# Altium footprint library PcbLib.PcbLib: 428 footprints (part 7 of 27)
Each footprint in its own frame and in the unit in brackets; x right, y up, seen from the top. Pads: shape width x height; smd on the part's side, far side on the other; paste and mask are expansions set on the pad; w line width, h text height; cw(c..) or ccw(c..) is an arc to the next point about the centre after c.
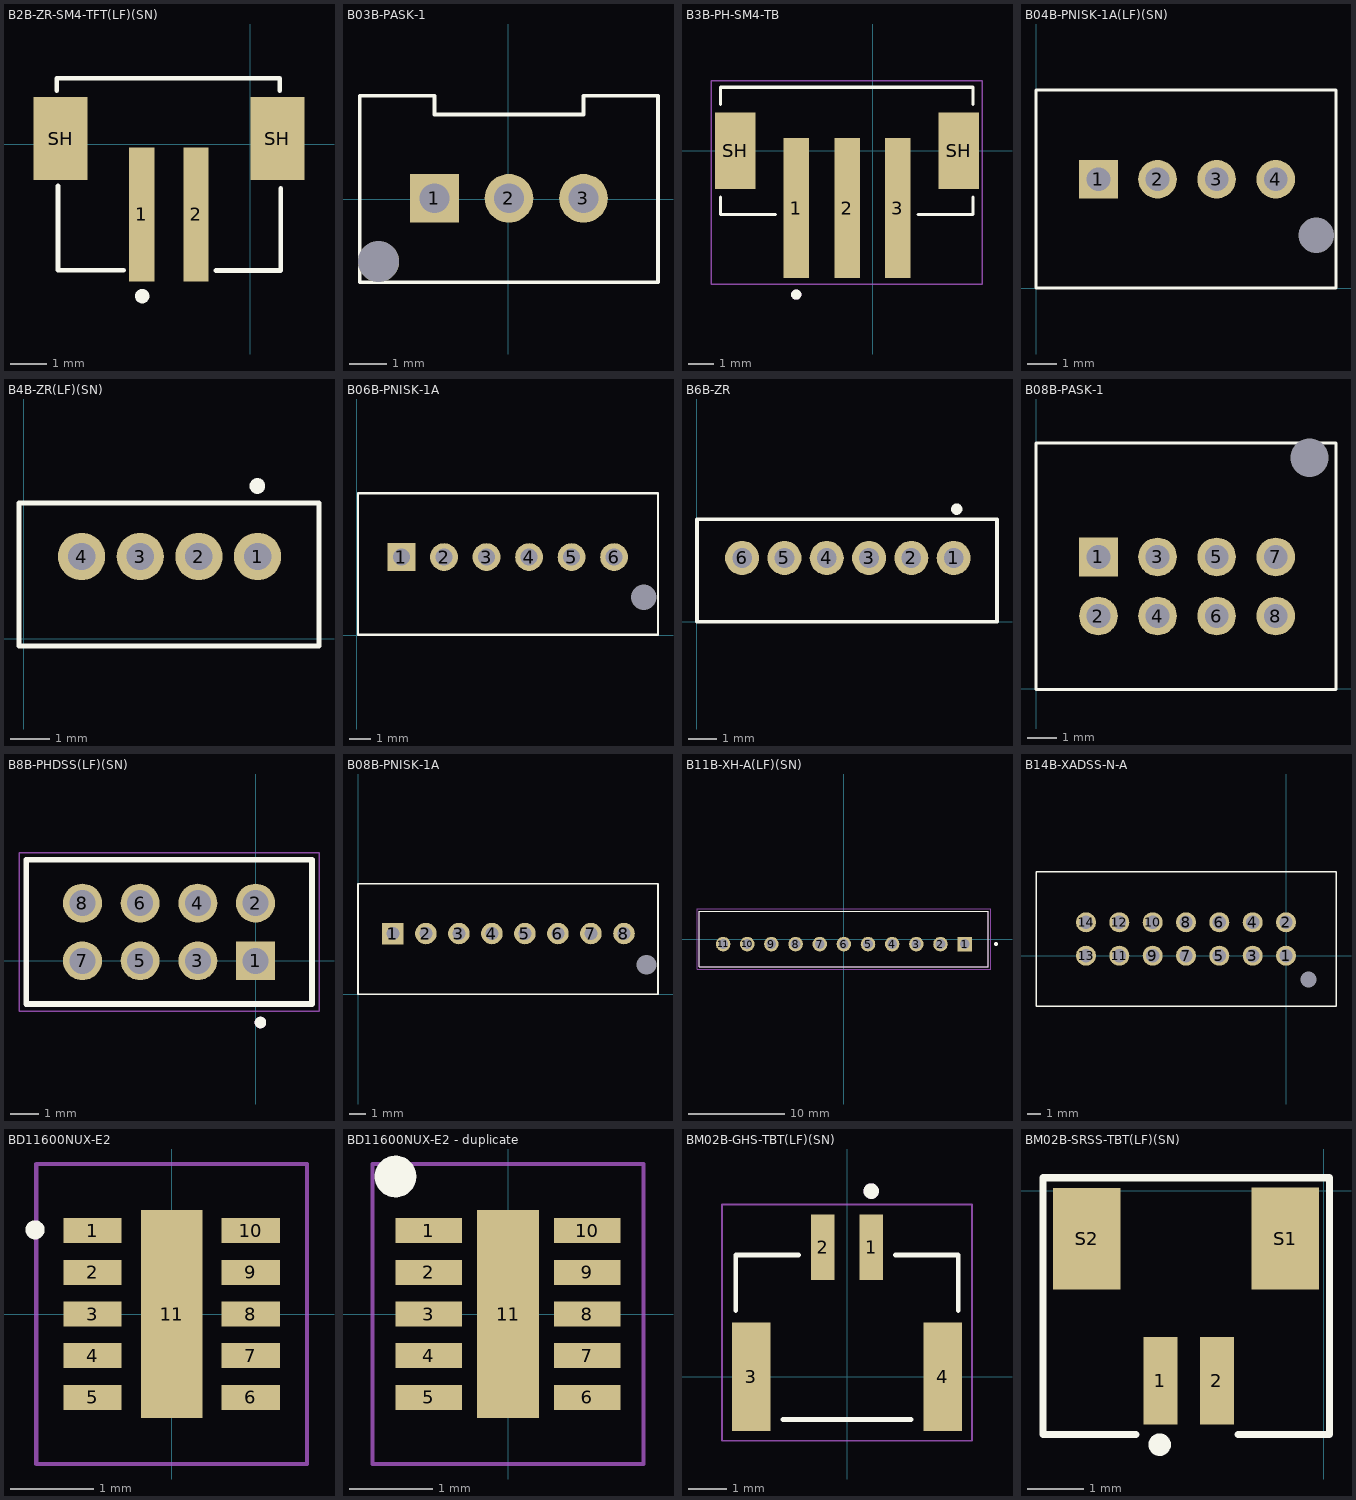
[diagram p6: the footprints below, top view; thin cyan lines are the x and y axes]

## B2B-ZR-SM4-TFT(LF)(SN) [mm]
height 6.6
pads (4):
  rect 0.7x3.7 smd: 1(-3,-1.95) 2(-1.5,-1.95)
  rect 1.5x2.3 smd: SH(-5.25,0.15) SH(0.753,0.15)
Top Overlay:
  circle w0.2: c-2.99,-4.21 r0.1
  lines w0.127: -5.35,1.48 -5.35,1.82 0.816,1.82 0.816,1.48 ; -5.32,-1.16 -5.32,-3.49 -3.5,-3.49 ; -0.96,-3.5 0.84,-3.5 0.84,-1.22
3D body "B2B-ZR-SM4-TF.STEP": height 5, standoff 0, extent -5.25,-3.41 0.75,1.79

## B03B-PASK-1 [mm]
pads (4):
  rect 1.308x1.308 / inner round 1.308 / far side rect 1.308x1.308 hole 0.8: 1(-1.976,0.022)
  round 1.308 hole 0.8: 2(0.024,0.022) 3(2.024,0.022)
  round 1.1 hole 1.1 unplated: ""(-3.476,-1.678)
Top Overlay:
  lines w0.1: -3.976,-2.228 4.024,-2.228 4.024,2.772 2.024,2.772 2.024,2.272 -1.976,2.272 -1.976,2.772 -3.976,2.772 -3.976,-2.228
3D body "step_temp.STEP": height 7.7, standoff -3, extent -3.976,-2.228 4.024,3.072

## B3B-PH-SM4-TB [mm]
height 6.6
pads (5):
  rect 1x5.5 smd: 1(-3,-2.25) 2(-1,-2.25) 3(1,-2.25)
  rect 1.6x3 smd: SH(-5.4,0) SH(3.393,0)
Top Overlay:
  circle w0.2: c-3,-5.65 r0.1
  lines w0.127: -5.975,-1.82 -5.975,-2.5 -3.82,-2.5 ; -5.975,1.82 -5.975,2.5 3.947,2.5 3.947,1.82 ; 1.798,-2.5 3.947,-2.5 3.947,-1.82
Mechanical 13:
  circle w0.2: c-3,-5.65 r0.1
Mechanical 15:
  lines w0.05: -6.335,-5.25 4.315,-5.25 4.315,2.75 -6.335,2.75 -6.335,-5.25
3D body "B3B-PH-SM4-TB.STEP": height 7.1, standoff 0.35, extent -5.998,-4.536 3.952,2.464

## B04B-PNISK-1A(LF)(SN) [mm]
pads (5):
  rect 1.308x1.308 hole 0.8: 1(2.115,3.686)
  round 1.308 hole 0.8: 2(4.115,3.686) 3(6.115,3.686) 4(8.115,3.686)
  round 0 hole 1.2 unplated: ""(9.49,1.79)
Top Overlay:
  lines w0.1: 0,0 0,6.71 10.16,6.71 10.16,0 0,0
3D body "B04B-PNISK-1A.STEP": height 10.2, standoff -3.4, extent 0.1,0.085 10.1,6.635

## B4B-ZR(LF)(SN) [mil]
pads (4):
  round 47.56 hole 27.56: 1(235.17,83) 2(176.11,83) 3(117.06,83) 4(58,83)
Top Overlay:
  circle w7.87: c235,154 r3.94
  lines w5: -5,-7 -5,137 297,137 297,-7 -5,-7
3D body "B4B-ZR--3DModel-STEP-56544.STEP": height 177.17, standoff -106.3, extent -1.06,-3.86 294.22,133.94

## B06B-PNISK-1A [mm]
pads (7):
  rect 1.308x1.308 hole 0.8: 1(2.115,3.686)
  round 1.308 hole 0.8: 2(4.115,3.686) 3(6.115,3.686) 4(8.115,3.686) 5(10.115,3.686) 6(12.115,3.686)
  round 0 hole 1.2 unplated: ""(13.52,1.79)
Top Overlay:
  lines w0.1: 0.07,0.03 14.18,0.03 14.18,6.69 0.07,6.69 0.07,0.03
3D body "B06B-PNISK-1A.STEP": height 10.2, standoff -3.4, extent 0.12,0.085 14.12,6.635

## B6B-ZR [mm]
pads (6):
  round 1.208 hole 0.7: 1(9.103,2.268) 2(7.603,2.268) 3(6.103,2.268) 4(4.603,2.268) 5(3.103,2.268) 6(1.603,2.268)
Top Overlay:
  circle w0.2: c9.21,4 r0.1
  lines w0.127: 0.003,0.01 10.64,0.01 10.64,3.64 0.003,3.64 0.003,0.01
3D body "B6B-ZR.step": height 4.5, standoff -2.7, extent 0.07,0.08 10.57,3.58

## B08B-PASK-1 [mm]
pads (9):
  rect 1.308x1.308 hole 0.8: 1(2.115,4.456)
  round 1.308 hole 0.8: 2(2.115,2.456) 3(4.115,4.456) 4(4.115,2.456) 5(6.115,4.456) 6(6.115,2.456) 7(8.115,4.456) 8(8.115,2.456)
  round 0 hole 1.3 unplated: ""(9.262,7.815)
Top Overlay:
  lines w0.1: 0,-0.031 0,8.315 10.16,8.315 10.16,-0.031 0,-0.031
3D body "B08B-PUDSS-1.STEP": height 9.6, standoff -3.1, extent 0.08,0.051 10.08,8.351

## B8B-PHDSS(LF)(SN) [mm]
pads (8):
  rect 1.35x1.35 / inner round 1.35 / far side rect 1.35x1.35 hole 0.9: 1(0,0)
  round 1.35 hole 0.9: 2(0,2) 3(-2,0) 4(-2,2) 5(-4,0) 6(-4,2) 7(-6,0) 8(-6,2)
Top Overlay:
  circle w0.2: c0.17,-2.14 r0.1
  lines w0.2: 1.905,-1.5 -7.95,-1.5 -7.95,3.5 1.95,3.5 ; 1.956,-1.5 1.956,3.5
Mechanical 13:
  circle w0.2: c0.17,-2.14 r0.1
Mechanical 15:
  lines w0.1: -7.95,-1.5 -7.95,3.5 1.95,3.5 1.95,-1.5 -7.95,-1.5
Mechanical 20:
  lines w0.05: -8.2,-1.75 -8.2,3.75 2.2,3.75 2.2,-1.75 -8.2,-1.75
3D body "B8B-PHDSS_LF__SN_.stp": height 6.5, standoff -3, extent -7.868,-1.484 2.032,3.516

## B08B-PNISK-1A [mm]
pads (9):
  rect 1.308x1.308 hole 0.8: 1(2.115,3.686)
  round 1.308 hole 0.8: 2(4.115,3.686) 3(6.115,3.686) 4(8.115,3.686) 5(10.115,3.686) 6(12.115,3.686) 7(14.115,3.686) 8(16.115,3.686)
  round 0 hole 1.2 unplated: ""(17.49,1.79)
Top Overlay:
  lines w0.1: 0,0 0,6.71 18.178,6.71 18.178,0 0,0
3D body "B08B-PNISK-1A.STEP": height 10.2, standoff -3.4, extent 0.106,0.083 18.106,6.633

## B11B-XH-A(LF)(SN) [mm]
height 7
pads (11):
  rect 1.508x1.508 / inner round 1.508 / far side rect 1.508x1.508 hole 1: 1(12.5,-0.525)
  round 1.508 hole 1: 2(10,-0.525) 3(7.5,-0.525) 4(5,-0.525) 5(2.5,-0.525) 6(0,-0.525) 7(-2.5,-0.525) 8(-5,-0.525) 9(-7.5,-0.525) 10(-10,-0.525) 11(-12.5,-0.525)
Top Overlay:
  circle w0.2: c15.75,-0.525 r0.1
  lines w0.127: -14.95,-2.875 -14.95,2.875 14.95,2.875 14.95,-2.875 -14.95,-2.875
Mechanical 13:
  circle w0.2: c15.75,-0.525 r0.1
  lines w0.127: -14.95,-2.875 -14.95,2.875 14.95,2.875 14.95,-2.875 -14.95,-2.875
Mechanical 15:
  lines w0.05: -15.2,-3.125 -15.2,3.125 15.2,3.125 15.2,-3.125 -15.2,-3.125
3D body "B11B-XH-A -LF--SN---3DModel-STEP-56544.STEP": height 7, standoff -3.4, extent -14.93,-2.919 14.97,2.831

## B14B-XADSS-N-A [mm]
pads (15):
  round 1.5 hole 1: 1(0,0) 2(0,2.5) 3(-2.5,0) 4(-2.5,2.5) 5(-5,0) 6(-5,2.5) 7(-7.5,0) 8(-7.5,2.5) 9(-10,0) 10(-10,2.5) 11(-12.5,0) 12(-12.5,2.5) 13(-15,0) 14(-15,2.5)
  round 0.6 hole 1.2 unplated: ""(1.7,-1.8)
Top Overlay:
  lines w0.1: -18.75,-3.8 -18.75,6.3 3.75,6.3 3.75,-3.8 -18.75,-3.8
3D body "B14B-XADSS-N-A.STEP": height 10.1, standoff -3.5, extent -18.79,-3.82 3.71,6.28

## BD11600NUX-E2 [mm]
pads (11):
  rect 0.7x0.3 smd: 1(-0.95,1) 2(-0.95,0.5) 3(-0.95,0) 4(-0.95,-0.5) 5(-0.95,-1) 6(0.95,-1) 7(0.95,-0.5) 8(0.95,0) 9(0.95,0.5) 10(0.95,1)
  rect 0.74x2.49 smd: 11(0,0)
Top Overlay:
  circle w0.127: c-1.64,1.01 r0.051
Mechanical 15:
  lines w0.05: -1.625,-1.8 -1.625,1.8 1.625,1.8 1.625,-1.8 -1.625,-1.8
3D body "BD11600NUX-E2.stp": height 0.6, standoff 0, extent -1.05,-1.5 1.05,1.5

## BD11600NUX-E2 - duplicate [mm]
pads (11):
  rect 0.8x0.3 smd: 1(-0.95,1) 2(-0.95,0.5) 3(-0.95,0) 4(-0.95,-0.5) 5(-0.95,-1) 6(0.95,-1) 7(0.95,-0.5) 8(0.95,0) 9(0.95,0.5) 10(0.95,1)
  rect 0.74x2.49 smd: 11(0,0)
Top Overlay:
  circle w0.25: c-1.35,1.65 r0.125
Mechanical 15:
  lines w0.05: -1.625,-1.8 -1.625,1.8 1.625,1.8 1.625,-1.8 -1.625,-1.8
3D body "BD11600NUX-E2.stp": height 0.6, standoff 0, extent -1.05,-1.5 1.05,1.5

## BM02B-GHS-TBT(LF)(SN) [mm]
pads (4):
  rect 0.6x1.7 smd: 1(0.625,3.35) 2(-0.625,3.35)
  rect 1x2.8 smd: 3(-2.475,0) 4(2.475,0)
Top Overlay:
  circle w0.2: c0.625,4.8 r0.1
  lines w0.127: -2.875,1.72 -2.875,3.15 -1.25,3.15 ; -1.65,-1.1 1.65,-1.1 ; 1.25,3.15 2.875,3.15 2.875,1.72
Mechanical 13:
  circle w0.2: c0.625,4.8 r0.1
Mechanical 15:
  lines w0.05: -3.225,-1.65 -3.225,4.45 3.225,4.45 3.225,-1.65 -3.225,-1.65
3D body "BM02B-GHS-TBT.STEP": height 4.28, standoff 0.07, extent -2.87,-1.125 2.88,3.825

## BM02B-SRSS-TBT(LF)(SN) [mm]
pads (4):
  rect 0.6x1.55 smd: 1(-2.895,-3.37) 2(-1.895,-3.37)
  rect 1.2x1.8 smd: S1(-0.686,-0.849) S2(-4.2,-0.85)
Top Overlay:
  circle w0.2: c-2.91,-4.5 r0.1
  lines w0.127: -3.327,-4.318 -4.978,-4.318 -4.978,0.229 0.102,0.229 0.102,-4.318 -1.524,-4.318
3D body "BM02B-SRSS-TBT--3DModel-STEP-56544.STEP": height 4.25, standoff 0, extent -4.438,-3.764 -0.438,-0.164